# Altium footprint library arduinoNano.PcbLib: 2 footprints
Each footprint in its own frame and in the unit in brackets; x right, y up, seen from the top. Pads: shape width x height; smd on the part's side, far side on the other; paste and mask are expansions set on the pad; w line width, h text height; cw(c..) or ccw(c..) is an arc to the next point about the centre after c.
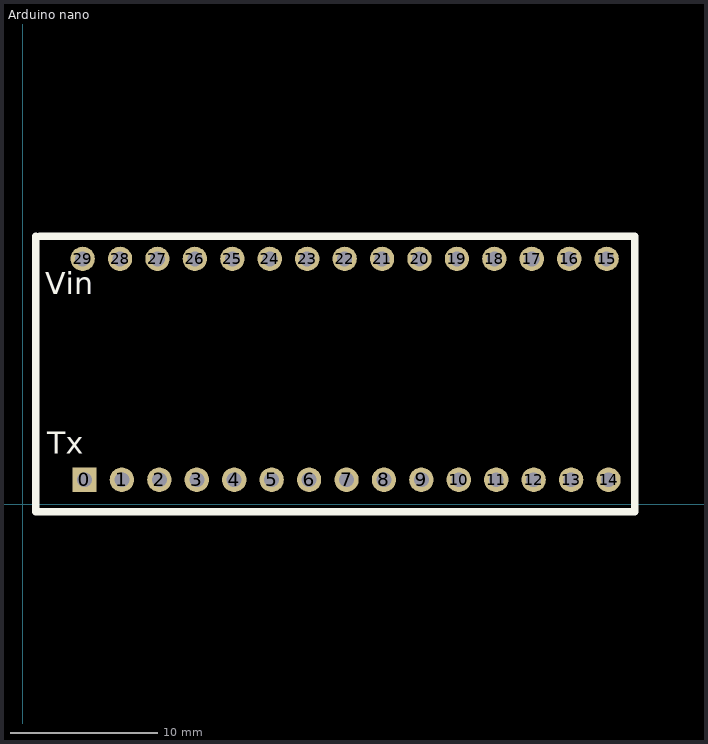
[diagram p0: the footprints below, top view; thin cyan lines are the x and y axes]

## Arduino nano [mil] "arduino nano"
height 1700
pads (30):
  rect 65x65 hole 40: 0(165,65)
  round 65 hole 40: 1(265,65) 2(365,65) 3(465,65) 4(565,65) 5(665,65) 6(765,65) 7(865,65) 8(965,65) 9(1065,65) 10(1165,65) 11(1265,65) 12(1365,65) 13(1465,65) 14(1565,65) 15(1560,655) 16(1460,655) 17(1360,655) 18(1260,655) 19(1160,655) 20(1060,655) 21(960,655) 22(860,655) 23(760,655) 24(660,655) 25(560,655) 26(460,655) 27(360,655) 28(260,655) 29(160,655)
Top Overlay:
  lines w10: 150,655 170,655 ; 155,65 175,65 ; 160,645 160,665 ; 165,55 165,75
  lines w20: 35,715 35,-20 1635,-20 1635,715 45,715
  text "Vin" at 60,540 h100
  text "Tx" at 65,115 h100
Top Solder:
  rectangle: 35,-15 1735,715
3D body "User Library-arduino_nano.STEP": height 397.64, standoff -334.65, extent -55.83,-3.66 1715.83,705

## PCBComponent_1 [mil]